# Altium footprint library microbuilder.PCBLIB: 422 footprints (part 19 of 27)
Each footprint in its own frame and in the unit in brackets; x right, y up, seen from the top. Pads: shape width x height; smd on the part's side, far side on the other; paste and mask are expansions set on the pad; w line width, h text height; cw(c..) or ccw(c..) is an arc to the next point about the centre after c.
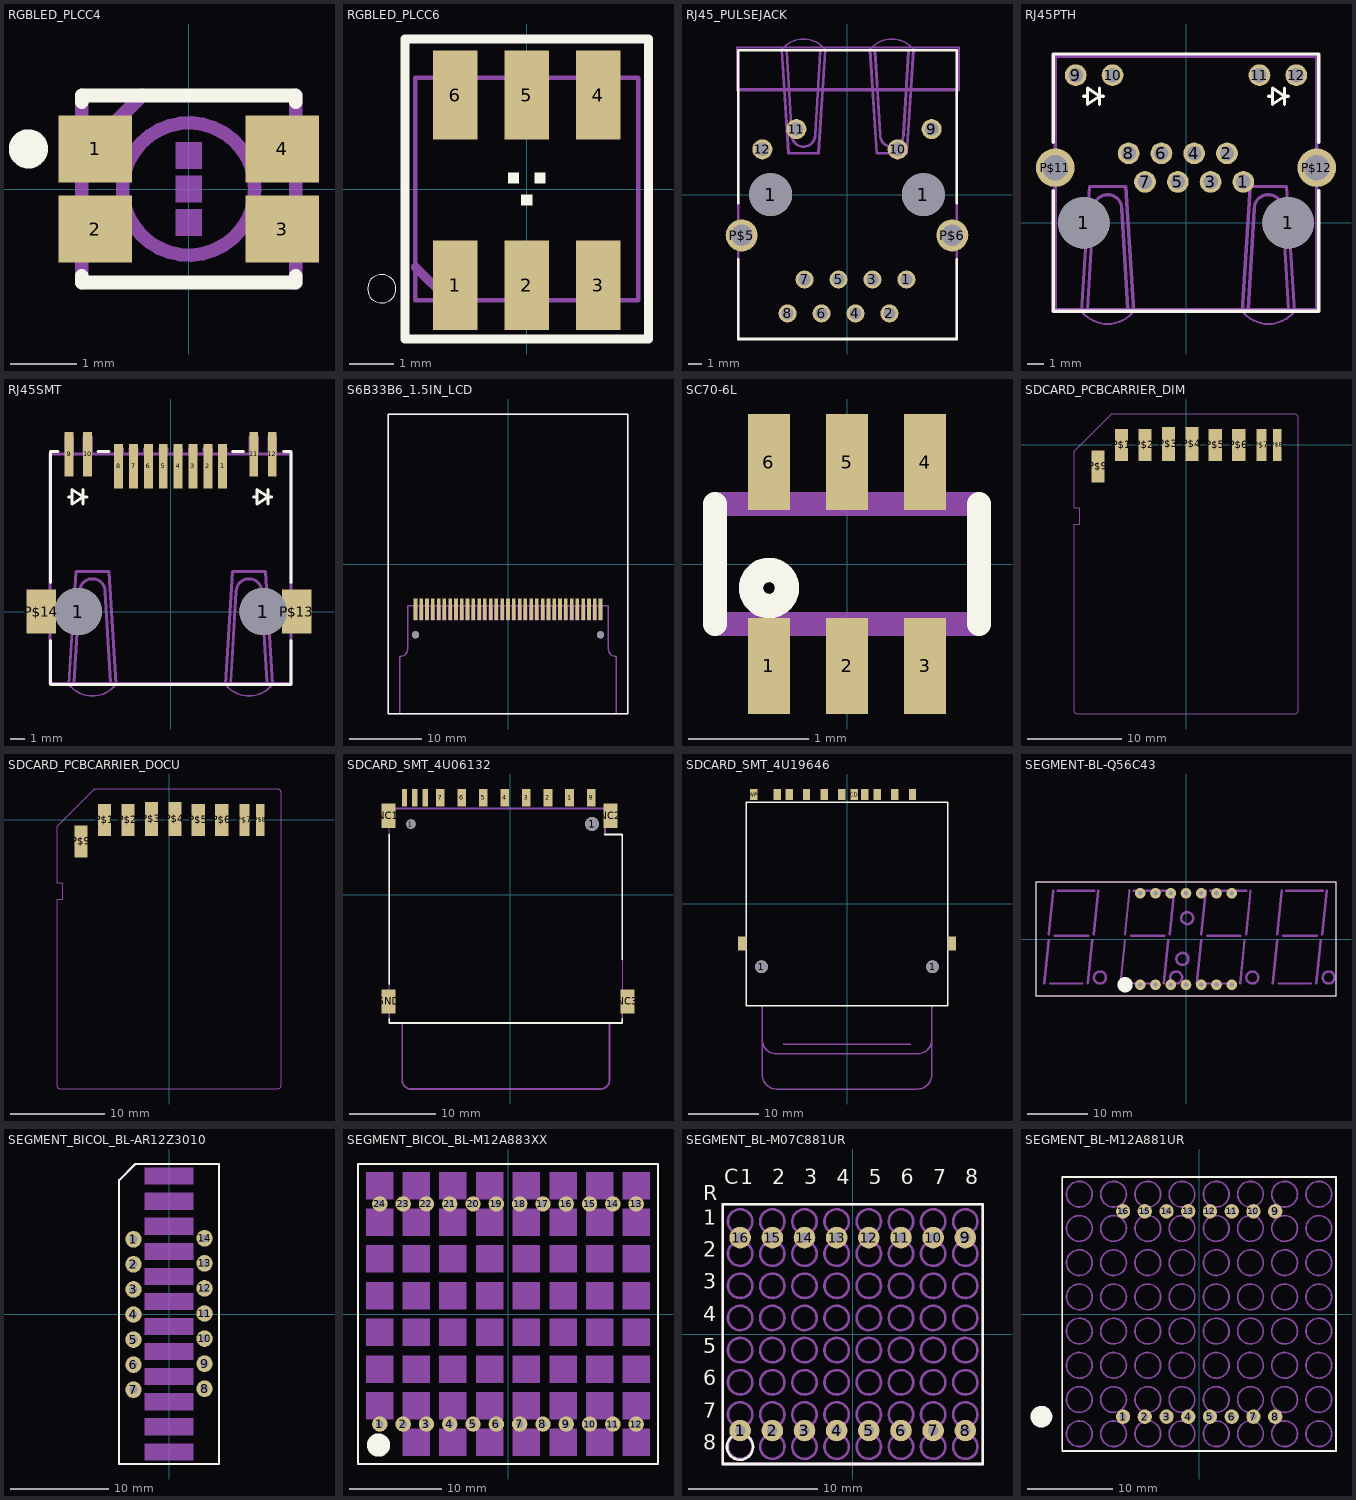
[diagram p18: the footprints below, top view; thin cyan lines are the x and y axes]

## RGBLED_PLCC4 [mm]
pads (4):
  rect 1.1x1 smd: 1(-1.4,0.6) 2(-1.4,-0.6) 3(1.4,-0.6) 4(1.4,0.6)
Top Overlay:
  circle w0.305: c-2.4,0.6 r0.141
  lines w0.203: -1.6,-1.3 -1.6,-1.4 1.6,-1.4 1.6,-1.3 ; -1.6,1.3 -1.6,1.4 1.6,1.4 1.6,1.3
Mechanical 16:
  circle w0.203: c0,0 r0.99
  rectangle: -0.2,-0.7 0.2,-0.3
  rectangle: -0.2,-0.2 0.2,0.2
  rectangle: -0.2,0.3 0.2,0.7
  lines w0.127: -1.6,-1.4 1.6,-1.4 ; -1.6,1.4 -0.7,1.4 1.6,1.4
  lines w0.203: -1.6,-1.4 -1.6,0.5 ; -1.6,1.4 -1.6,0.5 ; -0.7,1.4 -1.6,0.5 ; 1.6,-1.4 1.6,1.4

## RGBLED_PLCC6 [mm]
pads (6):
  rect 1x2 smd: 1(-1.6,-2.158) 2(0,-2.158) 3(1.6,-2.158) 4(1.6,2.108) 5(0,2.108) 6(-1.6,2.108)
Top Overlay:
  circle w0: c-3.254,-2.238 r0.318
  region: 0.125,-0.375 0.125,-0.125 -0.125,-0.125 -0.125,-0.375
  region: -0.175,0.125 -0.175,0.375 -0.425,0.375 -0.425,0.125
  region: 0.425,0.125 0.425,0.375 0.175,0.375 0.175,0.125
  lines w0.203: -2.73,-3.365 2.73,-3.365 2.73,3.365 -2.73,3.365 -2.73,-3.365
Top Paste:
  rectangle: 0.7,-2.275 1.4,-0.75
  rectangle: -0.25,-2.275 0.25,-0.75
  rectangle: -1.4,-2.275 -0.7,-0.75
  rectangle: 0.7,0.75 1.4,2.275
  rectangle: -0.25,0.75 0.25,2.275
  rectangle: -1.4,0.75 -0.7,2.275
Top Solder:
  circle w0: c-3.254,-2.238 r0.318
Mechanical 16:
  lines w0.102: -2.5,-2.5 -1.75,-2.5 2.5,-2.5 2.5,2.5 -2.5,2.5 -2.5,-2.5
  lines w0.203: -2.5,-1.75 -1.75,-2.5

## RJ45_PULSEJACK [mm]
pads (16):
  round 3.2 hole 3.2: 1(-5.715,0) 1(5.715,0)
  round 1.35 hole 0.9: 1(4.445,-6.35) 2(3.175,-8.89) 3(1.905,-6.35) 4(0.635,-8.89) 5(-0.635,-6.35) 6(-1.905,-8.89) 7(-3.175,-6.35) 8(-4.445,-8.89)
  round 1.5 hole 1: 9(6.325,4.9) 10(3.785,3.38) 11(-3.785,4.9) 12(-6.325,3.38)
  round 2.4 hole 1.6: P$5(-7.875,-3.05) P$6(7.875,-3.05)
Top Overlay:
  lines w0.203: -8.13,-4.83 -8.13,-10.8 8.2,-10.8 8.2,-4.83 ; -8.13,-0.64 -8.13,7.87 -8.13,10.79 8.2,10.79 8.2,7.87 8.2,-0.64
Mechanical 16:
  lines w0.127: -8.13,-10.8 8.2,-10.8 ; -8.13,7.87 -8.13,10.79 8.2,10.79 8.2,7.87 ; -4.878,10.834 cw(c-3.253,9.584) -1.628,10.834 ; 1.726,10.834 cw(c3.351,9.584) 4.976,10.834
  lines w0.203: -8.13,-10.8 -8.13,7.87 8.2,7.87 8.2,-10.8 ; -4.878,10.834 -4.378,3.084 -2.128,3.084 -1.628,10.834 ; -4.503,10.709 -4.128,4.459 ccw(c-3.253,4.459) -2.378,4.459 -2.003,10.709 ; 1.726,10.834 2.226,3.084 4.476,3.084 4.976,10.834 ; 2.101,10.709 2.476,4.459 ccw(c3.351,4.459) 4.226,4.459 4.601,10.709
  text "NO TRACE ZONE" at -5.842,8.89 h1.57
Mechanical 27:
  lines w0.127: -8.246,7.754 8.382,7.754 8.382,11 -8.246,11 -8.246,7.754

## RJ45PTH [mm]
pads (16):
  round 3.2 hole 3.2: 1(-6.35,0) 1(6.35,0)
  round 1.35 hole 0.9: 1(3.57,2.54) 2(2.55,4.32) 3(1.53,2.54) 4(0.51,4.32) 5(-0.51,2.54) 6(-1.53,4.32) 7(-2.55,2.54) 8(-3.57,4.32) 9(-6.86,9.18) 10(-4.57,9.18) 11(4.57,9.18) 12(6.86,9.18)
  round 2.4 hole 1.6: P$11(-8.13,3.43) P$12(8.13,3.43)
Top Overlay:
  lines w0.203: -8.25,2 -8.25,-5.5 8.25,-5.5 8.25,2 ; -8.25,5 -8.25,10.5 8.25,10.5 8.25,5 ; -6.375,7.875 -6.125,7.875 ; -5.375,7.375 -5.375,7.875 ; -5.375,8.375 -5.375,7.875 ; -5.125,7.875 -5.375,7.875 ; 5.125,7.875 5.375,7.875 ; 6.125,7.375 6.125,7.875 ; 6.125,8.375 6.125,7.875 ; 6.375,7.875 6.125,7.875 ; -6.125,7.875 -6.125,8.375 -5.375,7.875 ; -6.125,7.875 -6.125,7.375 -5.375,7.875 ; 5.375,7.875 5.375,8.375 6.125,7.875 ; 5.375,7.875 5.375,7.375 6.125,7.875
Mechanical 16:
  lines w0.127: -6.5,-5.5 ccw(c-4.875,-4.25) -3.25,-5.5 ; 3.5,-5.5 ccw(c5.125,-4.25) 6.75,-5.5
  lines w0.203: -6.5,-5.5 -6,2.25 -3.75,2.25 -3.25,-5.5 ; -6.125,-5.375 -5.75,0.875 cw(c-4.875,0.875) -4,0.875 -3.625,-5.375 ; 3.5,-5.5 4,2.25 6.25,2.25 6.75,-5.5 ; 3.875,-5.375 4.25,0.875 cw(c5.125,0.875) 6,0.875 6.375,-5.375 ; -8.13,-5.4 8.13,-5.4 8.13,10.35 -8.13,10.35 -8.13,-5.4

## RJ45SMT [mm]
pads (16):
  round 3.25 hole 3.25: 1(-6.35,0) 1(6.35,0)
  rect 0.61x3.05 smd: 1(3.57,9.98) 2(2.55,9.98) 3(1.53,9.98) 4(0.51,9.98) 5(-0.51,9.98) 6(-1.53,9.98) 7(-2.55,9.98) 8(-3.57,9.98) 9(-6.975,10.8) 10(-5.705,10.8) 11(5.705,10.8) 12(6.975,10.8)
  rect 2x3.05 smd: P$13(8.66,0) P$14(-8.89,0)
Top Overlay:
  lines w0.203: -8.25,-2 -8.25,-5 8.25,-5 8.25,-2 ; -8.25,2 -8.25,11 -7.75,11 ; -7.01,7.875 -6.76,7.875 ; -6.01,7.375 -6.01,7.875 ; -6.01,8.375 -6.01,7.875 ; -5.76,7.875 -6.01,7.875 ; -5,11 -4.25,11 ; 4.25,11 5,11 ; 5.69,7.875 5.94,7.875 ; 6.69,7.375 6.69,7.875 ; 6.69,8.375 6.69,7.875 ; 6.94,7.875 6.69,7.875 ; 7.75,11 8.25,11 8.25,2 ; -6.76,7.875 -6.76,8.375 -6.01,7.875 ; -6.76,7.875 -6.76,7.375 -6.01,7.875 ; 5.94,7.875 5.94,8.375 6.69,7.875 ; 5.94,7.875 5.94,7.375 6.69,7.875
Mechanical 16:
  lines w0.127: -7,-5 ccw(c-5.375,-3.75) -3.75,-5 ; 3.75,-5 ccw(c5.375,-3.75) 7,-5 ; 5.45,11.9 5.45,11.95
  lines w0.203: -8.375,-1.25 -9.375,-1.25 -9.375,1.25 -8.25,1.25 ; -8.28,-4.95 8.28,-4.95 ; -8.28,10.8 -7.2,10.8 ; -8.275,-4.95 -8.275,10.8 ; -7,-5 -6.5,2.75 -4.25,2.75 -3.75,-5 ; -6.625,-4.875 -6.25,1.375 cw(c-5.375,1.375) -4.5,1.375 -4.125,-4.875 ; -0.25,10.85 -0.25,11.2 -0.75,11.2 -0.75,10.8 ; 3.75,-5 4.25,2.75 6.5,2.75 7,-5 ; 3.8,10.85 3.8,11.2 3.35,11.2 3.35,10.8 ; 4.125,-4.875 4.5,1.375 cw(c5.375,1.375) 6.25,1.375 6.625,-4.875 ; 5.95,10.85 5.95,12 5.45,12 5.45,11.9 5.45,10.8 ; 8.25,-1.25 9.25,-1.25 9.25,1.25 8.25,1.25 ; 8.275,-4.95 8.275,10.8 ; 8.28,10.8 7.2,10.8 ; -7.2,10.8 -6.75,10.8 ; -7.2,10.8 -7.2,12 -6.75,12 -6.75,10.8 ; -6.75,10.8 -5.95,10.8 ; -5.95,10.8 -5.45,10.8 ; -5.95,10.8 -5.95,12 -5.45,12 -5.45,10.8 ; -5.45,10.8 -3.8,10.8 ; -3.8,10.8 -3.3,10.8 ; -3.8,10.8 -3.8,11.2 -3.3,11.2 -3.3,10.8 ; -3.3,10.8 -2.8,10.8 ; -2.8,10.8 -2.3,10.8 ; -2.8,10.8 -2.8,11.2 -2.3,11.2 -2.3,10.8 ; -2.3,10.8 -1.8,10.8 ; -1.8,10.8 -1.3,10.8 ; -1.8,10.8 -1.8,11.2 -1.3,11.2 -1.3,10.8 ; -1.3,10.8 -0.75,10.8 ; -0.75,10.8 0.3,10.8 ; 0.3,10.8 0.75,10.8 ; 0.3,10.8 0.3,11.2 0.75,11.2 0.75,10.8 ; 0.75,10.8 1.3,10.8 ; 1.3,10.8 1.75,10.8 ; 1.3,10.8 1.3,11.2 1.75,11.2 1.75,10.8 ; 1.75,10.8 2.3,10.8 ; 2.3,10.8 2.8,10.8 ; 2.3,10.8 2.3,11.2 2.8,11.2 2.8,10.8 ; 2.8,10.8 3.35,10.8 ; 3.35,10.8 5.45,10.8 ; 5.45,10.8 6.75,10.8 ; 6.75,10.8 7.2,10.8 ; 6.75,10.8 6.75,12 7.2,12 7.2,10.8

## S6B33B6_1.5IN_LCD [mm]
pads (35):
  round 1 hole 1: 1(-12.8,-9.8) 1(12.8,-9.8)
  rect 0.5x3 smd: P$1(-12.8,-6.25) P$2(-12,-6.25) P$3(-11.2,-6.25) P$4(-10.4,-6.25) P$5(-9.6,-6.25) P$6(-8.8,-6.25) P$7(-8,-6.25) P$8(-7.2,-6.25) P$9(-6.4,-6.25) P$10(-5.6,-6.25) P$11(-4.8,-6.25) P$12(-4,-6.25) P$13(-3.2,-6.25) P$14(-2.4,-6.25) P$15(-1.6,-6.25) P$16(-0.8,-6.25) P$17(0,-6.25) P$18(0.8,-6.25) P$19(1.6,-6.25) P$20(2.4,-6.25) P$21(3.2,-6.25) P$22(4,-6.25) P$23(4.8,-6.25) P$24(5.6,-6.25) P$25(6.4,-6.25) P$26(7.2,-6.25) P$27(8,-6.25) P$28(8.8,-6.25) P$29(9.6,-6.25) P$30(10.4,-6.25) P$31(11.2,-6.25) P$32(12,-6.25) P$33(12.8,-6.25)
Top Overlay:
  lines w0.203: -16.6,-20.75 -16.6,20.75 16.6,20.75 16.6,-20.75 -16.6,-20.75
Mechanical 16:
  drawing of 310 lines, arcs and shapes, not listed

## SC70-6L [mm]
pads (6):
  rect 0.35x0.8 smd: 1(-0.65,-0.85) 2(0,-0.85) 3(0.65,-0.85) 4(0.65,0.85) 5(0,0.85) 6(-0.65,0.85)
Top Overlay:
  circle w0.203: c-0.65,-0.2 r0.15
  lines w0.203: -1.1,-0.5 -1.1,0.5 ; 1.1,-0.5 1.1,0.5
Mechanical 16:
  rectangle: -0.8,-1.1 -0.5,-0.6
  rectangle: -0.15,-1.1 0.15,-0.6
  rectangle: 0.5,-1.1 0.8,-0.6
  rectangle: 0.5,0.6 0.8,1.1
  rectangle: -0.15,0.6 0.15,1.1
  rectangle: -0.8,0.6 -0.5,1.1
  lines w0.203: -1.1,-0.5 1.1,-0.5 ; -1.1,0.5 1.1,0.5

## SDCARD_PCBCARRIER_DIM [mm]
pads (9):
  rect 1.4x3.4 smd: P$1(-6.875,0) P$2(-4.375,0) P$5(3.125,0) P$6(5.625,0) P$9(-9.375,-2.3)
  rect 1.4x3.6 smd: P$3(-1.875,0.1) P$4(0.625,0.1)
  rect 1.1x3.4 smd: P$7(8.05,0)
  rect 0.9x3.4 smd: P$8(9.75,0)
Mechanical 1:
  lines w0.127: -12,-28.2 -12,-8.5 -11.4,-8.5 -11.4,-6.7 -12,-6.7 -12,-0.7 -8,3.3 11.5,3.3 cw(c11.5,2.8) 12,2.8 12,-28.2 cw(c11.5,-28.2) 11.5,-28.7 -11.5,-28.7 cw(c-11.5,-28.2) -12,-28.2
Mechanical 16:
  text "9/DAT2" at -10.5,-4.75 h0.63
  text "CD/DAT3" at -8.25,-2.5 h0.63
  text "CMD" at -5,-2.5 h0.63
  text "VSS" at -2.5,-2.5 h0.63
  text "VDD" at 0,-2.5 h0.63
  text "CLK" at 2.5,-2.5 h0.63
  text "VSS" at 5,-2.5 h0.63
  text "DAT0" at 7.25,-2.5 h0.63
  text "DAT1" at 9.25,-2.5 h0.63

## SDCARD_PCBCARRIER_DOCU [mm]
pads (9):
  rect 1.4x3.4 smd: P$1(-6.875,0) P$2(-4.375,0) P$5(3.125,0) P$6(5.625,0) P$9(-9.375,-2.3)
  rect 1.4x3.6 smd: P$3(-1.875,0.1) P$4(0.625,0.1)
  rect 1.1x3.4 smd: P$7(8.05,0)
  rect 0.9x3.4 smd: P$8(9.75,0)
Mechanical 16:
  lines w0.127: -12,-28.2 -12,-8.5 -11.4,-8.5 -11.4,-6.7 -12,-6.7 -12,-0.7 -8,3.3 11.5,3.3 cw(c11.5,2.8) 12,2.8 12,-28.2 cw(c11.5,-28.2) 11.5,-28.7 -11.5,-28.7 cw(c-11.5,-28.2) -12,-28.2
  text "9/DAT2" at -10.5,-4.75 h0.63
  text "CD/DAT3" at -8.25,-2.5 h0.63
  text "CMD" at -5,-2.5 h0.63
  text "VSS" at -2.5,-2.5 h0.63
  text "VDD" at 0,-2.5 h0.63
  text "CLK" at 2.5,-2.5 h0.63
  text "VSS" at 5,-2.5 h0.63
  text "DAT0" at 7.25,-2.5 h0.63
  text "DAT1" at 9.25,-2.5 h0.63

## SDCARD_SMT_4U06132 [mm]
pads (17):
  round 1.1 hole 1.1: 1(-11.5,8.2)
  rect 1x2.008 smd: 1(6.88,11.254) 2(4.38,11.254) 3(1.88,11.254) 4(-0.62,11.254) 5(-3.12,11.254) 6(-5.62,11.254) 7(-8.12,11.254) 9(9.38,11.254)
  round 1.6 hole 1.6: 1(9.5,8.2)
  rect 0.6x2.008 smd: 8(-9.845,11.254) CD(-11.045,11.254) WP(-12.245,11.254)
  rect 1.6x2.8 smd: GND(-14.1,-12.35) NC1(-14.1,9.15) NC2(11.631,9.15) NC3(13.6,-12.35)
Top Overlay:
  lines w0.203: -14,-14.35 -14,-14.85 13,-14.85 13,-14.35 ; -14,-10.35 -14,7 ; 11,7 13,7 13,-7.5
Mechanical 16:
  lines w0.127: -14,-14.85 -12.5,-14.85 11.5,-14.85 13,-14.85 ; -14,-11.35 -14,8 ; 11,7 13,7 13,-11.35
  lines w0.203: -14,-14.85 -14,-13.35 ; -12.5,-14.85 -12.5,-21.5 ccw(c-11.5,-21.5) -11.5,-22.5 10.5,-22.5 ccw(c10.5,-21.5) 11.5,-21.5 11.5,-14.85 ; 11,7 11,8 ; 13,-14.85 13,-13.35 ; -14,-13.35 -14,-11.35 -14.5,-11.35 ccw(c-14.5,-11.6) -14.75,-11.6 -14.75,-13.1 ccw(c-14.5,-13.1) -14.5,-13.35 -14,-13.35 ; -14,10 -14,8 -14.5,8 cw(c-14.5,8.25) -14.75,8.25 -14.75,9.75 cw(c-14.5,9.75) -14.5,10 -14,10 ; -14,10 11,10 ; 11,8 11,10 ; 11,8 11.5,8 ccw(c11.5,8.25) 11.75,8.25 11.75,9.75 ccw(c11.5,9.75) 11.5,10 11,10 ; 13,-13.35 13,-11.35 13.75,-11.35 cw(c13.75,-11.6) 14,-11.6 14,-13.1 cw(c13.75,-13.1) 13.75,-13.35 13,-13.35
  text "SDCARD" at -3.5,-18 h1.97
  text "CONFIRM FOOTPRINT!" at -9.525,-0.635 h1.97

## SDCARD_SMT_4U19646 [mm]
pads (15):
  round 1.8 hole 1.8: 1(-12.1,-8.9) 1(12.1,-8.9)
  rect 1.05x1.56 smd: CD(1.02,15.47) P$1(6.77,15.47) P$2(4.27,15.47) P$3(2.52,15.47) P$4(-0.73,15.47) P$5(-3.23,15.47) P$6(-5.73,15.47) P$7(-8.15,15.47) P$8(-9.85,15.47) P$9(9.27,15.47) WP(-13.2,15.47)
  rect 1.2x2 smd: GND@1(14.8,-5.6) GND@2(-14.8,-5.6)
Top Overlay:
  lines w0.203: -14.25,-14.4 14.25,-14.4 14.25,14.4 -14.25,14.4 -14.25,-14.4
Mechanical 16:
  lines w0.203: -12,-19.4 -12,-24.2 ccw(c-10,-24.2) -10,-26.2 10,-26.2 ccw(c10,-24.2) 12,-24.2 12,-19.4 ; -12,-14.4 -12,-19.2 ccw(c-10,-19.2) -10,-21.2 10,-21.2 ccw(c10,-19.2) 12,-19.2 12,-14.4 ; -9,-19.9 9,-19.9
  text "Push" at -1.9,-19.5 h1.97
  text "Lock" at -1.7,-22.8 h1.97
  text "Dashing" at -3.2,-25.5 h1.97

## SEGMENT-BL-Q56C43 [mil]
pads (14):
  round 70 hole 31.5: P$1(-300,-300) P$2(-200,-300) P$3(-100,-300) P$4(0,-300) P$5(100,-300) P$6(200,-300) P$7(300,-300) P$8(300,300) P$9(200,300) P$10(100,300) P$11(0,300) P$12(-100,300) P$13(-200,300) P$14(-300,300)
Top Overlay:
  circle w50: c-400,-300 r25
  lines w8: -984.25,-374.02 -984.25,374.02 984.25,374.02 984.25,-374.02 -984.25,-374.02
Mechanical 16:
  circle w16: c-564.74,-252.68 r39.37
  circle w16: c-64.74,-252.68 r39.37
  circle w16: c435.26,-252.68 r39.37
  circle w16: c935.26,-252.68 r39.37
  circle w16: c8.09,137.09 r39.37
  circle w16: c-23.41,-130.63 r39.37
  lines w5: -984.25,-374.02 984.25,-374.02 984.25,374.02 -984.25,374.02 -984.25,-374.02
  lines w16: -929.69,-292.05 -900.32,-7.09 ; -900.32,32.28 -870.94,317.24 ; -890.32,-292.05 -682.2,-292.05 ; -860.94,22.28 -642.83,22.28 ; -841.57,317.24 -603.46,317.24 ; -645.35,-292.05 -615.98,-7.09 ; -605.98,32.28 -576.61,317.24 ; -429.69,-292.05 -400.32,-7.09 ; -400.32,32.28 -370.94,317.24 ; -390.32,-292.05 -182.2,-292.05 ; -360.94,22.28 -142.83,22.28 ; -341.57,317.24 -103.46,317.24 ; -145.35,-292.05 -115.98,-7.09 ; -105.98,32.28 -76.61,317.24 ; 70.32,-292.05 99.69,-7.09 ; 99.69,32.28 129.06,317.24 ; 109.69,-292.05 317.8,-292.05 ; 139.06,22.28 357.17,22.28 ; 158.43,317.24 396.54,317.24 ; 354.65,-292.05 384.02,-7.09 ; 394.02,32.28 423.39,317.24 ; 570.32,-292.05 599.69,-7.09 ; 599.69,32.28 629.06,317.24 ; 609.69,-292.05 817.8,-292.05 ; 639.06,22.28 857.17,22.28 ; 658.43,317.24 896.54,317.24 ; 854.65,-292.05 884.02,-7.09 ; 894.02,32.28 923.39,317.24
  text "DP" at -599.21,-350.39 h62
  text "A" at -744.88,257.87 h62
  text "B" at -561.81,157.48 h62
  text "C" at -595.28,-135.83 h62
  text "D" at -796.06,-263.78 h62
  text "E" at -963.39,-131.89 h62
  text "F" at -933.86,157.48 h62
  text "G" at -766.54,53.15 h62
  text "D5" at -10.63,196.85 h62
  text "D6" at -46.06,-68.9 h62

## SEGMENT_BICOL_BL-AR12Z3010 [mil]
pads (14):
  round 66 hole 31.5: 1(-141.73,298.03) 2(-141.73,198.03) 3(-141.73,98.03) 4(-141.73,-1.97) 5(-141.73,-101.97) 6(-141.73,-201.97) 7(-141.73,-301.97) 8(141.73,-298.03) 9(141.73,-198.03) 10(141.73,-98.03) 11(141.73,1.97) 12(141.73,101.97) 13(141.73,201.97) 14(141.73,301.97)
Top Overlay:
  lines w8: -198.82,-598.43 198.82,-598.43 198.82,598.43 -134.06,598.43 -198.82,534.45 -198.82,-598.43
Mechanical 16:
  rectangle: -98.43,15.75 98.43,84.25
  rectangle: -98.43,115.75 98.43,184.25
  rectangle: -98.43,215.75 98.43,284.25
  rectangle: -98.43,315.75 98.43,384.25
  rectangle: -98.43,415.75 98.43,484.25
  rectangle: -98.43,515.75 98.43,584.25
  rectangle: -98.43,-84.25 98.43,-15.75
  rectangle: -98.43,-184.25 98.43,-115.75
  rectangle: -98.43,-284.25 98.43,-215.75
  rectangle: -98.43,-384.25 98.43,-315.75
  rectangle: -98.43,-484.25 98.43,-415.75
  rectangle: -98.43,-584.25 98.43,-515.75
  lines w5: -198.82,-598.43 198.82,-598.43 198.82,598.43
  lines w8: -198.82,-598.43 -198.82,534.45 -134.06,598.43 198.82,598.43
  text "A" at 225,525 h77.5
  text "B" at 225,425 h77.5
  text "C" at 225,325 h77.5
  text "D" at 225,225 h77.5
  text "E" at 225,125 h77.5
  text "F" at 225,25 h77.5
  text "G" at 225,-75 h77.5
  text "H" at 225,-175 h77.5
  text "I" at 225,-275 h77.5
  text "J" at 225,-375 h77.5
  text "K" at 225,-475 h77.5
  text "L" at 225,-575 h77.5

## SEGMENT_BICOL_BL-M12A883XX [mil]
pads (24):
  round 66 hole 31.5: 1(-550,-472.44) 2(-450,-472.44) 3(-350,-472.44) 4(-250,-472.44) 5(-150,-472.44) 6(-50,-472.44) 7(50,-472.44) 8(150,-472.44) 9(250,-472.44) 10(350,-472.44) 11(450,-472.44) 12(550,-472.44) 13(550,472.44) 14(450,472.44) 15(350,472.44) 16(250,472.44) 17(150,472.44) 18(50,472.44) 19(-50,472.44) 20(-150,472.44) 21(-250,472.44) 22(-350,472.44) 23(-450,472.44) 24(-550,472.44)
Top Overlay:
  circle w50: c-555.59,-562.44 r25
  lines w8: -643.7,-643.7 643.7,-643.7 643.7,643.7 -643.7,643.7 -643.7,-643.7
Mechanical 16:
  rectangle: -610.24,492.13 -492.13,610.24
  rectangle: -452.76,492.13 -334.65,610.24
  rectangle: -295.28,492.13 -177.17,610.24
  rectangle: -137.8,492.13 -19.69,610.24
  rectangle: 19.69,492.13 137.8,610.24
  rectangle: 177.17,492.13 295.28,610.24
  rectangle: 334.65,492.13 452.76,610.24
  rectangle: 492.13,492.13 610.24,610.24
  rectangle: 492.13,334.65 610.24,452.76
  rectangle: 334.65,334.65 452.76,452.76
  rectangle: 177.17,334.65 295.28,452.76
  rectangle: 19.69,334.65 137.8,452.76
  rectangle: -137.8,334.65 -19.69,452.76
  rectangle: -295.28,334.65 -177.17,452.76
  rectangle: -610.24,334.65 -492.13,452.76
  rectangle: -452.76,334.65 -334.65,452.76
  rectangle: -610.24,177.17 -492.13,295.28
  rectangle: -452.76,177.17 -334.65,295.28
  rectangle: -295.28,177.17 -177.17,295.28
  rectangle: -137.8,177.17 -19.69,295.28
  rectangle: 19.69,177.17 137.8,295.28
  rectangle: 177.17,177.17 295.28,295.28
  rectangle: 334.65,177.17 452.76,295.28
  rectangle: 492.13,177.17 610.24,295.28
  rectangle: 492.13,19.69 610.24,137.8
  rectangle: 492.13,-137.8 610.24,-19.69
  rectangle: 334.65,-137.8 452.76,-19.69
  rectangle: 334.65,19.69 452.76,137.8
  rectangle: 177.17,19.69 295.28,137.8
  rectangle: 19.69,19.69 137.8,137.8
  rectangle: -137.8,19.69 -19.69,137.8
  rectangle: -295.28,19.69 -177.17,137.8
  rectangle: -452.76,19.69 -334.65,137.8
  rectangle: -610.24,19.69 -492.13,137.8
  rectangle: -610.24,-137.8 -492.13,-19.69
  rectangle: -452.76,-137.8 -334.65,-19.69
  rectangle: -295.28,-137.8 -177.17,-19.69
  rectangle: -137.8,-137.8 -19.69,-19.69
  rectangle: 19.69,-137.8 137.8,-19.69
  rectangle: 177.17,-137.8 295.28,-19.69
  rectangle: 492.13,-295.28 610.24,-177.17
  rectangle: 334.65,-295.28 452.76,-177.17
  rectangle: -610.24,-295.28 -492.13,-177.17
  rectangle: -452.76,-295.28 -334.65,-177.17
  rectangle: -295.28,-295.28 -177.17,-177.17
  rectangle: -137.8,-295.28 -19.69,-177.17
  rectangle: 19.69,-295.28 137.8,-177.17
  rectangle: 177.17,-295.28 295.28,-177.17
  rectangle: 492.13,-452.76 610.24,-334.65
  rectangle: 334.65,-452.76 452.76,-334.65
  rectangle: -610.24,-452.76 -492.13,-334.65
  rectangle: -452.76,-452.76 -334.65,-334.65
  rectangle: -295.28,-452.76 -177.17,-334.65
  rectangle: -137.8,-452.76 -19.69,-334.65
  rectangle: 19.69,-452.76 137.8,-334.65
  rectangle: 177.17,-452.76 295.28,-334.65
  rectangle: 492.13,-610.24 610.24,-492.13
  rectangle: 334.65,-610.24 452.76,-492.13
  rectangle: -452.76,-610.24 -334.65,-492.13
  rectangle: -295.28,-610.24 -177.17,-492.13
  rectangle: -137.8,-610.24 -19.69,-492.13
  rectangle: 19.69,-610.24 137.8,-492.13
  rectangle: 177.17,-610.24 295.28,-492.13
  lines w8: -643.7,-643.7 643.7,-643.7 643.7,643.7 -643.7,643.7 -643.7,-643.7

## SEGMENT_BL-M07C881UR [mil]
pads (16):
  round 66 hole 31.5: 1(-344.49,-295.28) 2(-246.06,-295.28) 3(-147.64,-295.28) 4(-49.21,-295.28) 5(49.21,-295.28) 6(147.64,-295.28) 7(246.06,-295.28) 8(344.49,-295.28) 9(344.49,295.28) 10(246.06,295.28) 11(147.64,295.28) 12(49.21,295.28) 13(-49.21,295.28) 14(-147.64,295.28) 15(-246.06,295.28) 16(-344.49,295.28)
Top Overlay:
  circle w8: c-345,-345 r40
  lines w8: -397.64,-397.64 397.64,-397.64 397.64,397.64 -397.64,397.64 -397.64,-397.64
  text "C" at -393.7,442.91 h77.5
  text "R" at -457.09,393.7 h77.5
  text "1" at -344.49,442.91 h77.5
  text "2" at -246.06,442.91 h77.5
  text "3" at -147.64,442.91 h77.5
  text "4" at -49.21,442.91 h77.5
  text "5" at 49.21,442.91 h77.5
  text "6" at 147.64,442.91 h77.5
  text "7" at 246.06,442.91 h77.5
  text "8" at 344.49,442.91 h77.5
  text "1" at -457.09,319.88 h77.5
  text "2" at -457.09,221.46 h77.5
  text "3" at -457.09,123.03 h77.5
  text "4" at -457.09,24.61 h77.5
  text "5" at -457.09,-73.82 h77.5
  text "6" at -457.09,-172.24 h77.5
  text "7" at -457.09,-270.67 h77.5
  text "8" at -457.09,-369.09 h77.5
Mechanical 16:
  circle w8: c-344.49,344.49 r37.4
  circle w8: c-246.06,344.49 r37.4
  circle w8: c-147.64,344.49 r37.4
  circle w8: c-49.21,344.49 r37.4
  circle w8: c49.21,344.49 r37.4
  circle w8: c147.64,344.49 r37.4
  circle w8: c246.06,344.49 r37.4
  circle w8: c344.49,344.49 r37.4
  circle w8: c-344.49,246.06 r37.4
  circle w8: c-246.06,246.06 r37.4
  circle w8: c-147.64,246.06 r37.4
  circle w8: c-49.21,246.06 r37.4
  circle w8: c49.21,246.06 r37.4
  circle w8: c147.64,246.06 r37.4
  circle w8: c246.06,246.06 r37.4
  circle w8: c344.49,246.06 r37.4
  circle w8: c-344.49,147.64 r37.4
  circle w8: c-246.06,147.64 r37.4
  circle w8: c-147.64,147.64 r37.4
  circle w8: c-49.21,147.64 r37.4
  circle w8: c49.21,147.64 r37.4
  circle w8: c147.64,147.64 r37.4
  circle w8: c246.06,147.64 r37.4
  circle w8: c344.49,147.64 r37.4
  circle w8: c-344.49,49.21 r37.4
  circle w8: c-246.06,49.21 r37.4
  circle w8: c-147.64,49.21 r37.4
  circle w8: c-49.21,49.21 r37.4
  circle w8: c49.21,49.21 r37.4
  circle w8: c147.64,49.21 r37.4
  circle w8: c246.06,49.21 r37.4
  circle w8: c344.49,49.21 r37.4
  circle w8: c-344.49,-49.21 r37.4
  circle w8: c-246.06,-49.21 r37.4
  circle w8: c-147.64,-49.21 r37.4
  circle w8: c-49.21,-49.21 r37.4
  circle w8: c49.21,-49.21 r37.4
  circle w8: c147.64,-49.21 r37.4
  circle w8: c246.06,-49.21 r37.4
  circle w8: c344.49,-49.21 r37.4
  circle w8: c-344.49,-147.64 r37.4
  circle w8: c-246.06,-147.64 r37.4
  circle w8: c-147.64,-147.64 r37.4
  circle w8: c-49.21,-147.64 r37.4
  circle w8: c49.21,-147.64 r37.4
  circle w8: c147.64,-147.64 r37.4
  circle w8: c246.06,-147.64 r37.4
  circle w8: c344.49,-147.64 r37.4
  circle w8: c-344.49,-246.06 r37.4
  circle w8: c-246.06,-246.06 r37.4
  circle w8: c-147.64,-246.06 r37.4
  circle w8: c-49.21,-246.06 r37.4
  circle w8: c49.21,-246.06 r37.4
  circle w8: c147.64,-246.06 r37.4
  circle w8: c246.06,-246.06 r37.4
  circle w8: c344.49,-246.06 r37.4
  circle w8: c-344.49,-344.49 r37.4
  circle w8: c-246.06,-344.49 r37.4
  circle w8: c-147.64,-344.49 r37.4
  circle w8: c-49.21,-344.49 r37.4
  circle w8: c49.21,-344.49 r37.4
  circle w8: c147.64,-344.49 r37.4
  circle w8: c246.06,-344.49 r37.4
  circle w8: c344.49,-344.49 r37.4
  lines w8: -397.64,-397.64 397.64,-397.64 397.64,397.64 -397.64,397.64 -397.64,-397.64

## SEGMENT_BL-M12A881UR [mil]
pads (16):
  round 66 hole 31.5: 1(-350,-472.44) 2(-250,-472.44) 3(-150,-472.44) 4(-50,-472.44) 5(50,-472.44) 6(150,-472.44) 7(250,-472.44) 8(350,-472.44) 9(350,472.44) 10(250,472.44) 11(150,472.44) 12(50,472.44) 13(-50,472.44) 14(-150,472.44) 15(-250,472.44) 16(-350,472.44)
Top Overlay:
  circle w50: c-725.59,-472.44 r25
  lines w8: -629.92,-629.92 629.92,-629.92 629.92,629.92 -629.92,629.92 -629.92,-629.92
Mechanical 16:
  circle w8: c-551.18,551.18 r59.06
  circle w8: c-393.7,551.18 r59.06
  circle w8: c-236.22,551.18 r59.06
  circle w8: c-78.74,551.18 r59.06
  circle w8: c78.74,551.18 r59.06
  circle w8: c236.22,551.18 r59.06
  circle w8: c393.7,551.18 r59.06
  circle w8: c551.18,551.18 r59.06
  circle w8: c-551.18,393.7 r59.06
  circle w8: c-393.7,393.7 r59.06
  circle w8: c-236.22,393.7 r59.06
  circle w8: c-78.74,393.7 r59.06
  circle w8: c78.74,393.7 r59.06
  circle w8: c236.22,393.7 r59.06
  circle w8: c393.7,393.7 r59.06
  circle w8: c551.18,393.7 r59.06
  circle w8: c-551.18,236.22 r59.06
  circle w8: c-393.7,236.22 r59.06
  circle w8: c-236.22,236.22 r59.06
  circle w8: c-78.74,236.22 r59.06
  circle w8: c78.74,236.22 r59.06
  circle w8: c236.22,236.22 r59.06
  circle w8: c393.7,236.22 r59.06
  circle w8: c551.18,236.22 r59.06
  circle w8: c-551.18,78.74 r59.06
  circle w8: c-393.7,78.74 r59.06
  circle w8: c-236.22,78.74 r59.06
  circle w8: c-78.74,78.74 r59.06
  circle w8: c78.74,78.74 r59.06
  circle w8: c236.22,78.74 r59.06
  circle w8: c393.7,78.74 r59.06
  circle w8: c551.18,78.74 r59.06
  circle w8: c-551.18,-78.74 r59.06
  circle w8: c-393.7,-78.74 r59.06
  circle w8: c-236.22,-78.74 r59.06
  circle w8: c-78.74,-78.74 r59.06
  circle w8: c78.74,-78.74 r59.06
  circle w8: c236.22,-78.74 r59.06
  circle w8: c393.7,-78.74 r59.06
  circle w8: c551.18,-78.74 r59.06
  circle w8: c-551.18,-236.22 r59.06
  circle w8: c-393.7,-236.22 r59.06
  circle w8: c-236.22,-236.22 r59.06
  circle w8: c-78.74,-236.22 r59.06
  circle w8: c78.74,-236.22 r59.06
  circle w8: c236.22,-236.22 r59.06
  circle w8: c393.7,-236.22 r59.06
  circle w8: c551.18,-236.22 r59.06
  circle w8: c-551.18,-393.7 r59.06
  circle w8: c-393.7,-393.7 r59.06
  circle w8: c-236.22,-393.7 r59.06
  circle w8: c-78.74,-393.7 r59.06
  circle w8: c78.74,-393.7 r59.06
  circle w8: c236.22,-393.7 r59.06
  circle w8: c393.7,-393.7 r59.06
  circle w8: c551.18,-393.7 r59.06
  circle w8: c-551.18,-551.18 r59.06
  circle w8: c-393.7,-551.18 r59.06
  circle w8: c-236.22,-551.18 r59.06
  circle w8: c-78.74,-551.18 r59.06
  circle w8: c78.74,-551.18 r59.06
  circle w8: c236.22,-551.18 r59.06
  circle w8: c393.7,-551.18 r59.06
  circle w8: c551.18,-551.18 r59.06
  lines w8: -629.92,-629.92 629.92,-629.92 629.92,629.92 -629.92,629.92 -629.92,-629.92